# Altium footprint library ic.PcbLib: 129 footprints (part 8 of 9)
Each footprint in its own frame and in the unit in brackets; x right, y up, seen from the top. Pads: shape width x height; smd on the part's side, far side on the other; paste and mask are expansions set on the pad; w line width, h text height; cw(c..) or ccw(c..) is an arc to the next point about the centre after c.
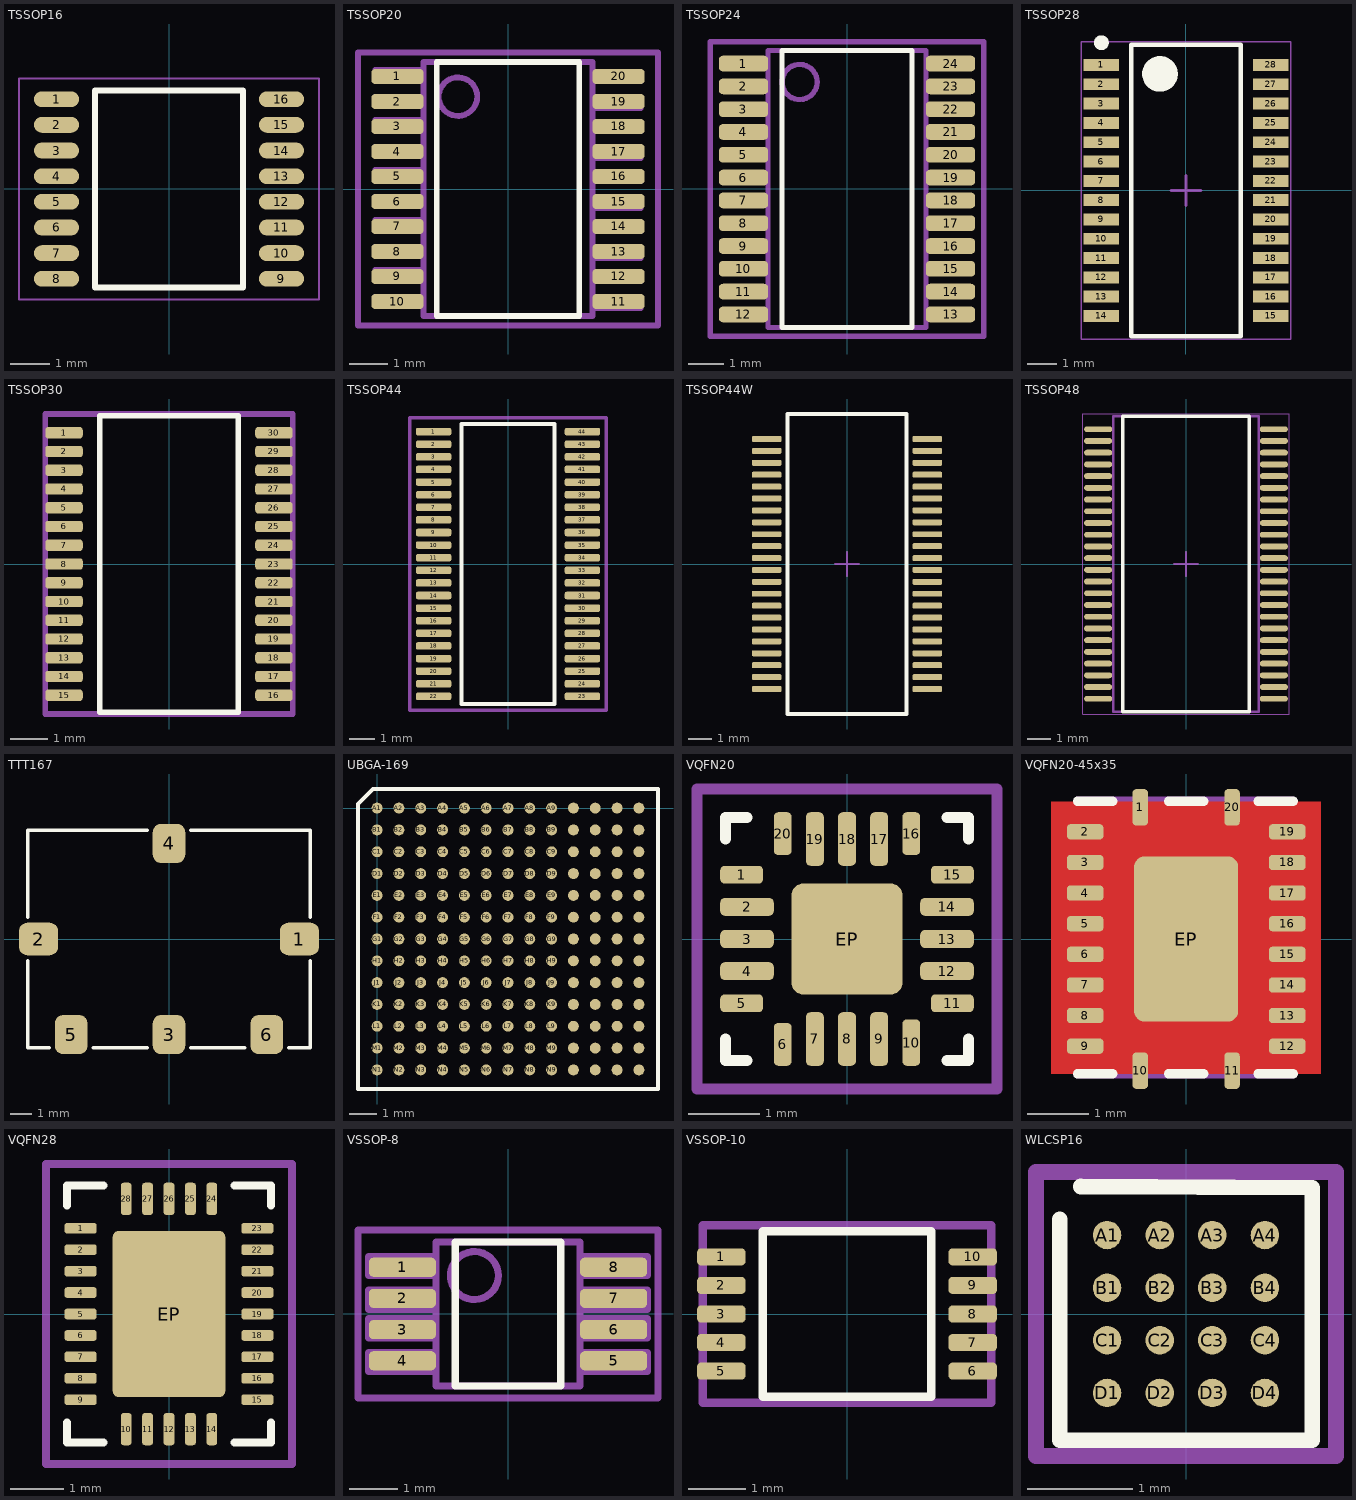
[diagram p7: the footprints below, top view; thin cyan lines are the x and y axes]

## TSSOP16 [mm] "TSOP, 16-Leads, Body 5,00x4,40mm, Pitch 0,65mm, IPC High Density"
height 1.2
pads (16):
  oval 1.15x0.4 smd: 1(-2.85,2.275) 2(-2.85,1.625) 3(-2.85,0.975) 4(-2.85,0.325) 5(-2.85,-0.325) 6(-2.85,-0.975) 7(-2.85,-1.625) 8(-2.85,-2.275) 9(2.85,-2.275) 10(2.85,-1.625) 11(2.85,-0.975) 12(2.85,-0.325) 13(2.85,0.325) 14(2.85,0.975) 15(2.85,1.625) 16(2.85,2.275)
Top Overlay:
  lines w0.15: -1.875,-2.5 -1.875,2.5 1.875,2.5 1.875,-2.5 -1.875,-2.5
  text "." at -2.9,3 h0.1
Top Courtyard:
  lines w0.05: -3.8,-2.8 -3.8,2.8 3.8,2.8 3.8,-2.8 -3.8,-2.8
3D body "TSSOP16.step": height 1.2, standoff 0, extent -3.2,-2.5 3.2,2.5

## TSSOP20 [mm] "TSSOP, 20-Leads, Body 6,50x4,40mm, Pitch 0,65mm, IPC Medium Density"
height 1.2
pads (20):
  rrect50% 1.35x0.4 smd: 1(-2.875,2.925) 2(-2.875,2.275) 3(-2.875,1.625) 4(-2.875,0.975) 5(-2.875,0.325) 6(-2.875,-0.325) 7(-2.875,-0.975) 8(-2.875,-1.625) 9(-2.875,-2.275) 10(-2.875,-2.925) 11(2.875,-2.925) 12(2.875,-2.275) 13(2.875,-1.625) 14(2.875,-0.975) 15(2.875,-0.325) 16(2.875,0.325) 17(2.875,0.975) 18(2.875,1.625) 19(2.875,2.275) 20(2.875,2.925)
Top Overlay:
  lines w0.15: -1.85,-3.3 1.85,-3.3 1.85,3.3 -1.85,3.3 -1.85,-3.3
  text "." at -2.9,3.6 h0.1
Top Courtyard:
  lines w0.15: -3.9,-3.55 3.9,-3.55 3.9,3.55 -3.9,3.55 -3.9,-3.55
Mechanical 29:
  circle w0.15: c-1.3,2.4 r0.5
  lines w0.15: -2.2,-3 -3.45,-3 -3.45,-2.8 -2.2,-2.8 ; -2.2,-2.3 -3.45,-2.3 -3.45,-2.1 -2.2,-2.1 ; -2.2,-1.7 -3.45,-1.7 -3.45,-1.5 -2.2,-1.5 ; -2.2,-1 -3.45,-1 -3.45,-0.8 -2.2,-0.8 ; -2.2,-0.4 -3.45,-0.4 -3.45,-0.2 -2.2,-0.2 ; -2.2,0.3 -3.45,0.3 -3.45,0.5 -2.2,0.5 ; -2.2,0.9 -3.45,0.9 -3.45,1.1 -2.2,1.1 ; -2.2,1.6 -3.45,1.6 -3.45,1.8 -2.2,1.8 ; -2.2,2.2 -3.45,2.2 -3.45,2.4 -2.2,2.4 ; -2.2,2.9 -3.45,2.9 -3.45,3.1 -2.2,3.1 ; 2.2,-3.1 3.45,-3.1 3.45,-2.9 2.2,-2.9 ; 2.2,-2.4 3.45,-2.4 3.45,-2.2 2.2,-2.2 ; 2.2,-1.8 3.45,-1.8 3.45,-1.6 2.2,-1.6 ; 2.2,-1.1 3.45,-1.1 3.45,-0.9 2.2,-0.9 ; 2.2,-0.5 3.45,-0.5 3.45,-0.3 2.2,-0.3 ; 2.2,0.2 3.45,0.2 3.45,0.4 2.2,0.4 ; 2.2,0.8 3.45,0.8 3.45,1 2.2,1 ; 2.2,1.5 3.45,1.5 3.45,1.7 2.2,1.7 ; 2.2,2.1 3.45,2.1 3.45,2.3 2.2,2.3 ; 2.2,2.8 3.45,2.8 3.45,3 2.2,3 ; -2.2,-3.3 2.2,-3.3 2.2,3.3 -2.2,3.3 -2.2,-3.3
  text ".Designator" at -3.3,3.6 h1
3D body "TSSOP-20.step": height 1.2, standoff 0, extent -3.2,-3.3 3.2,3.3

## TSSOP24 [mm] "TSOP, 24-Leads, Body 7,80x4,40mm, Pitch 0,65mm, IPC Medium Density"
height 1.1
pads (24):
  rrect50% 1.4x0.45 smd: 1(-2.95,3.575) 2(-2.95,2.925) 3(-2.95,2.275) 4(-2.95,1.625) 5(-2.95,0.975) 6(-2.95,0.325) 7(-2.95,-0.325) 8(-2.95,-0.975) 9(-2.95,-1.625) 10(-2.95,-2.275) 11(-2.95,-2.925) 12(-2.95,-3.575) 13(2.95,-3.575) 14(2.95,-2.925) 15(2.95,-2.275) 16(2.95,-1.625) 17(2.95,-0.975) 18(2.95,-0.325) 19(2.95,0.325) 20(2.95,0.975) 21(2.95,1.625) 22(2.95,2.275) 23(2.95,2.925) 24(2.95,3.575)
Top Overlay:
  lines w0.15: -1.85,-3.95 1.85,-3.95 1.85,3.95 -1.85,3.95 -1.85,-3.95
  text "." at -3,4.3 h0.1
Top Courtyard:
  lines w0.15: -3.9,-4.2 3.9,-4.2 3.9,4.2 -3.9,4.2 -3.9,-4.2
Mechanical 29:
  circle w0.15: c-1.35,3.05 r0.5
  lines w0.15: -2.25,-3.7 -3.5,-3.7 -3.5,-3.5 -2.25,-3.5 ; -2.25,-3 -3.5,-3 -3.5,-2.8 -2.25,-2.8 ; -2.25,-2.4 -3.5,-2.4 -3.5,-2.2 -2.25,-2.2 ; -2.25,-1.7 -3.5,-1.7 -3.5,-1.5 -2.25,-1.5 ; -2.25,-1.1 -3.5,-1.1 -3.5,-0.9 -2.25,-0.9 ; -2.25,-0.4 -3.5,-0.4 -3.5,-0.2 -2.25,-0.2 ; -2.25,0.2 -3.5,0.2 -3.5,0.4 -2.25,0.4 ; -2.25,0.9 -3.5,0.9 -3.5,1.1 -2.25,1.1 ; -2.25,1.5 -3.5,1.5 -3.5,1.7 -2.25,1.7 ; -2.25,2.2 -3.5,2.2 -3.5,2.4 -2.25,2.4 ; -2.25,2.8 -3.5,2.8 -3.5,3 -2.25,3 ; -2.25,3.5 -3.5,3.5 -3.5,3.7 -2.25,3.7 ; 2.25,-3.7 3.5,-3.7 3.5,-3.5 2.25,-3.5 ; 2.25,-3 3.5,-3 3.5,-2.8 2.25,-2.8 ; 2.25,-2.4 3.5,-2.4 3.5,-2.2 2.25,-2.2 ; 2.25,-1.7 3.5,-1.7 3.5,-1.5 2.25,-1.5 ; 2.25,-1.1 3.5,-1.1 3.5,-0.9 2.25,-0.9 ; 2.25,-0.4 3.5,-0.4 3.5,-0.2 2.25,-0.2 ; 2.25,0.2 3.5,0.2 3.5,0.4 2.25,0.4 ; 2.25,0.9 3.5,0.9 3.5,1.1 2.25,1.1 ; 2.25,1.5 3.5,1.5 3.5,1.7 2.25,1.7 ; 2.25,2.2 3.5,2.2 3.5,2.4 2.25,2.4 ; 2.25,2.8 3.5,2.8 3.5,3 2.25,3 ; 2.25,3.5 3.5,3.5 3.5,3.7 2.25,3.7 ; -2.25,-3.95 2.25,-3.95 2.25,3.95 -2.25,3.95 -2.25,-3.95
  text ".Designator" at -2,-0.4 h1

## TSSOP28 [mm] "TSOP, 28-Leads, Body 9,70x4,40mm, Pitch 0,65mm, IPC High Density"
height 1.2
pads (28):
  rect 1.2x0.4 smd: 1(-2.85,4.225) 2(-2.85,3.575) 3(-2.85,2.925) 4(-2.85,2.275) 5(-2.85,1.625) 6(-2.85,0.975) 7(-2.85,0.325) 8(-2.85,-0.325) 9(-2.85,-0.975) 10(-2.85,-1.625) 11(-2.85,-2.275) 12(-2.85,-2.925) 13(-2.85,-3.575) 14(-2.85,-4.225) 15(2.85,-4.225) 16(2.85,-3.575) 17(2.85,-2.925) 18(2.85,-2.275) 19(2.85,-1.625) 20(2.85,-0.975) 21(2.85,-0.325) 22(2.85,0.325) 23(2.85,0.975) 24(2.85,1.625) 25(2.85,2.275) 26(2.85,2.925) 27(2.85,3.575) 28(2.85,4.225)
Top Overlay:
  circle w0.25: c-2.85,4.975 r0.125
  circle w0.6: c-0.875,3.925 r0.3
  lines w0.15: -1.85,-4.9 -1.85,4.9 1.85,4.9 1.85,-4.9 -1.85,-4.9
Top Courtyard:
  lines w0.05: -3.525,-5 -3.525,5 3.525,5 3.525,-5 -3.525,-5
  lines w0.1: -0.5,0 0.5,0 ; 0,-0.5 0,0.5
3D body "TSSOP28.step": height 2.65, standoff 0, extent -3.2,-4.9 3.2,4.9

## TSSOP30 [mm] "TSSOP, 30-Leads, Body 7,80x4,40mm, Pitch 0,50mm, IPC Medium Density"
height 1.2
pads (30):
  rrect50% 1x0.3 smd: 1(-2.8,3.5) 2(-2.8,3) 3(-2.8,2.5) 4(-2.8,2) 5(-2.8,1.5) 6(-2.8,1) 7(-2.8,0.5) 8(-2.8,0) 9(-2.8,-0.5) 10(-2.8,-1) 11(-2.8,-1.5) 12(-2.8,-2) 13(-2.8,-2.5) 14(-2.8,-3) 15(-2.8,-3.5) 16(2.8,-3.5) 17(2.8,-3) 18(2.8,-2.5) 19(2.8,-2) 20(2.8,-1.5) 21(2.8,-1) 22(2.8,-0.5) 23(2.8,0) 24(2.8,0.5) 25(2.8,1) 26(2.8,1.5) 27(2.8,2) 28(2.8,2.5) 29(2.8,3) 30(2.8,3.5)
Top Overlay:
  lines w0.15: -1.85,-3.95 -1.85,3.95 1.85,3.95 1.85,-3.95 -1.85,-3.95
  text "." at -2.948,4 h0.1
Top Courtyard:
  lines w0.15: -3.3,-4 -3.3,4 3.3,4 3.3,-4 -3.3,-4
3D body "TSSOP30.step": height 1.2, standoff 0, extent -3.2,-3.95 3.2,3.95

## TSSOP44 [mm] "TSSOP, 44-Leads, Body 11,00x4,40mm, Pitch 0,50mm, IPC Medium Density"
height 1.2
pads (44):
  rrect50% 1.4x0.3 smd: 1(-2.95,5.25) 2(-2.95,4.75) 3(-2.95,4.25) 4(-2.95,3.75) 5(-2.95,3.25) 6(-2.95,2.75) 7(-2.95,2.25) 8(-2.95,1.75) 9(-2.95,1.25) 10(-2.95,0.75) 11(-2.95,0.25) 12(-2.95,-0.25) 13(-2.95,-0.75) 14(-2.95,-1.25) 15(-2.95,-1.75) 16(-2.95,-2.25) 17(-2.95,-2.75) 18(-2.95,-3.25) 19(-2.95,-3.75) 20(-2.95,-4.25) 21(-2.95,-4.75) 22(-2.95,-5.25) 23(2.95,-5.25) 24(2.95,-4.75) 25(2.95,-4.25) 26(2.95,-3.75) 27(2.95,-3.25) 28(2.95,-2.75) 29(2.95,-2.25) 30(2.95,-1.75) 31(2.95,-1.25) 32(2.95,-0.75) 33(2.95,-0.25) 34(2.95,0.25) 35(2.95,0.75) 36(2.95,1.25) 37(2.95,1.75) 38(2.95,2.25) 39(2.95,2.75) 40(2.95,3.25) 41(2.95,3.75) 42(2.95,4.25) 43(2.95,4.75) 44(2.95,5.25)
Top Overlay:
  lines w0.15: -1.85,-5.55 1.85,-5.55 1.85,5.55 -1.85,5.55 -1.85,-5.55
  text "." at -3,5.9 h0.1
Top Courtyard:
  lines w0.15: -3.9,-5.8 -3.9,5.8 3.9,5.8 3.9,-5.8 -3.9,-5.8
3D body "TSSOP44.step": height 1.2, standoff 0, extent -3.2,-5.55 3.2,5.55

## TSSOP44W [mm] "SSOP, 44-Leads, Body 12,80x5,30mm, Pitch 0,50mm, IPC High Density"
height 2
pads (44):
  rrect50% 1.25x0.25 smd: 1(-3.375,5.25) 2(-3.375,4.75) 3(-3.375,4.25) 4(-3.375,3.75) 5(-3.375,3.25) 6(-3.375,2.75) 7(-3.375,2.25) 8(-3.375,1.75) 9(-3.375,1.25) 10(-3.375,0.75) 11(-3.375,0.25) 12(-3.375,-0.25) 13(-3.375,-0.75) 14(-3.375,-1.25) 15(-3.375,-1.75) 16(-3.375,-2.25) 17(-3.375,-2.75) 18(-3.375,-3.25) 19(-3.375,-3.75) 20(-3.375,-4.25) 21(-3.375,-4.75) 22(-3.375,-5.25) 23(3.375,-5.25) 24(3.375,-4.75) 25(3.375,-4.25) 26(3.375,-3.75) 27(3.375,-3.25) 28(3.375,-2.75) 29(3.375,-2.25) 30(3.375,-1.75) 31(3.375,-1.25) 32(3.375,-0.75) 33(3.375,-0.25) 34(3.375,0.25) 35(3.375,0.75) 36(3.375,1.25) 37(3.375,1.75) 38(3.375,2.25) 39(3.375,2.75) 40(3.375,3.25) 41(3.375,3.75) 42(3.375,4.25) 43(3.375,4.75) 44(3.375,5.25)
Top Overlay:
  lines w0.15: -2.5,-6.3 -2.5,6.3 2.5,6.3 2.5,-6.3 -2.5,-6.3
  text "." at -4,6 h0.1
Top Courtyard:
  lines w0.1: -0.5,0 0.5,0 ; 0,-0.5 0,0.5
3D body "TSSOP44.step": height 1.2, standoff 0, extent -3.2,-5.55 3.2,5.55

## TSSOP48 [mm] "TSSOP, 48-Leads, Body 12,50x6,10mm, Pitch 0,50mm, IPC High Density"
height 1.2
pads (48):
  oval 1.2x0.25 smd: 1(-3.75,5.75) 2(-3.75,5.25) 3(-3.75,4.75) 4(-3.75,4.25) 5(-3.75,3.75) 6(-3.75,3.25) 7(-3.75,2.75) 8(-3.75,2.25) 9(-3.75,1.75) 10(-3.75,1.25) 11(-3.75,0.75) 12(-3.75,0.25) 13(-3.75,-0.25) 14(-3.75,-0.75) 15(-3.75,-1.25) 16(-3.75,-1.75) 17(-3.75,-2.25) 18(-3.75,-2.75) 19(-3.75,-3.25) 20(-3.75,-3.75) 21(-3.75,-4.25) 22(-3.75,-4.75) 23(-3.75,-5.25) 24(-3.75,-5.75) 25(3.75,-5.75) 26(3.75,-5.25) 27(3.75,-4.75) 28(3.75,-4.25) 29(3.75,-3.75) 30(3.75,-3.25) 31(3.75,-2.75) 32(3.75,-2.25) 33(3.75,-1.75) 34(3.75,-1.25) 35(3.75,-0.75) 36(3.75,-0.25) 37(3.75,0.25) 38(3.75,0.75) 39(3.75,1.25) 40(3.75,1.75) 41(3.75,2.25) 42(3.75,2.75) 43(3.75,3.25) 44(3.75,3.75) 45(3.75,4.25) 46(3.75,4.75) 47(3.75,5.25) 48(3.75,5.75)
Top Overlay:
  lines w0.15: -2.7,-6.3 -2.7,6.3 2.7,6.3 2.7,-6.3 -2.7,-6.3
  text "." at -3.824,6.401 h0.1
Top Courtyard:
  lines w0.05: -4.4,-6.4 -4.4,6.4 4.4,6.4 4.4,-6.4 -4.4,-6.4
  lines w0.1: -0.5,0 0.5,0 ; 0,-0.5 0,0.5
Top Assembly:
  lines w0.1: -3.1,-6.3 -3.1,6.3 3.1,6.3 3.1,-6.3 -3.1,-6.3
3D body "TSSOP48.step": height 1.2, standoff 0, extent -4.05,-6.3 4.05,6.3

## TTT167 [mm]
height 6
pads (6):
  rrect50% 1.8x1.5 smd: 1(6,0) 2(-6,0)
  rrect50% 1.5x1.8 smd: 3(0,-4.4) 4(0,4.4) 5(-4.5,-4.4) 6(4.5,-4.4)
Top Overlay:
  lines w0.15: -6.5,-1 -6.5,-5 -5.5,-5 ; -6.5,1 -6.5,5 -1,5 ; -3.5,-5 -1,-5 ; 1,-5 3.5,-5 ; 1,5 6.5,5 6.5,1 ; 5.5,-5 6.5,-5 6.5,-1
3D body: height 0.5, standoff 0, extent -6.35,-4.825 6.35,4.825
3D body: height 6, standoff 0.5, extent -6,-4.4 6,4.4

## UBGA-169 [mm] "BGA289_0P8_14X14"
height 0.1
pads (169):
  round 0.4 smd mask-0.01: A1(0,0) A2(0.8,0) A3(1.6,0) A4(2.4,0) A5(3.2,0) A6(4,0) A7(4.8,0) A8(5.6,0) A9(6.4,0) A10(7.2,0) A11(8,0) A12(8.8,0) A13(9.6,0) B1(0,-0.8) B2(0.8,-0.8) B3(1.6,-0.8) B4(2.4,-0.8) B5(3.2,-0.8) B6(4,-0.8) B7(4.8,-0.8) B8(5.6,-0.8) B9(6.4,-0.8) B10(7.2,-0.8) B11(8,-0.8) B12(8.8,-0.8) B13(9.6,-0.8) C1(0,-1.6) C2(0.8,-1.6) C3(1.6,-1.6) C4(2.4,-1.6) C5(3.2,-1.6) C6(4,-1.6) C7(4.8,-1.6) C8(5.6,-1.6) C9(6.4,-1.6) C10(7.2,-1.6) C11(8,-1.6) C12(8.8,-1.6) C13(9.6,-1.6) D1(0,-2.4) D2(0.8,-2.4) D3(1.6,-2.4) D4(2.4,-2.4) D5(3.2,-2.4) D6(4,-2.4) D7(4.8,-2.4) D8(5.6,-2.4) D9(6.4,-2.4) D10(7.2,-2.4) D11(8,-2.4) D12(8.8,-2.4) D13(9.6,-2.4) E1(0,-3.2) E2(0.8,-3.2) E3(1.6,-3.2) E4(2.4,-3.2) E5(3.2,-3.2) E6(4,-3.2) E7(4.8,-3.2) E8(5.6,-3.2) E9(6.4,-3.2) E10(7.2,-3.2) E11(8,-3.2) E12(8.8,-3.2) E13(9.6,-3.2) F1(0,-4) F2(0.8,-4) F3(1.6,-4) F4(2.4,-4) F5(3.2,-4) F6(4,-4) F7(4.8,-4) F8(5.6,-4) F9(6.4,-4) F10(7.2,-4) F11(8,-4) F12(8.8,-4) F13(9.6,-4) G1(0,-4.8) G2(0.8,-4.8) G3(1.6,-4.8) G4(2.4,-4.8) G5(3.2,-4.8) G6(4,-4.8) G7(4.8,-4.8) G8(5.6,-4.8) G9(6.4,-4.8) G10(7.2,-4.8) G11(8,-4.8) G12(8.8,-4.8) G13(9.6,-4.8) H1(0,-5.6) H2(0.8,-5.6) H3(1.6,-5.6) H4(2.4,-5.6) H5(3.2,-5.6) H6(4,-5.6) H7(4.8,-5.6) H8(5.6,-5.6) H9(6.4,-5.6) H10(7.2,-5.6) H11(8,-5.6) H12(8.8,-5.6) H13(9.6,-5.6) J1(0,-6.4) J2(0.8,-6.4) J3(1.6,-6.4) J4(2.4,-6.4) J5(3.2,-6.4) J6(4,-6.4) J7(4.8,-6.4) J8(5.6,-6.4) J9(6.4,-6.4) J10(7.2,-6.4) J11(8,-6.4) J12(8.8,-6.4) J13(9.6,-6.4) K1(0,-7.2) K2(0.8,-7.2) K3(1.6,-7.2) K4(2.4,-7.2) K5(3.2,-7.2) K6(4,-7.2) K7(4.8,-7.2) K8(5.6,-7.2) K9(6.4,-7.2) K10(7.2,-7.2) K11(8,-7.2) K12(8.8,-7.2) K13(9.6,-7.2) L1(0,-8) L2(0.8,-8) L3(1.6,-8) L4(2.4,-8) L5(3.2,-8) L6(4,-8) L7(4.8,-8) L8(5.6,-8) L9(6.4,-8) L10(7.2,-8) L11(8,-8) L12(8.8,-8) L13(9.6,-8) M1(0,-8.8) M2(0.8,-8.8) M3(1.6,-8.8) M4(2.4,-8.8) M5(3.2,-8.8) M6(4,-8.8) M7(4.8,-8.8) M8(5.6,-8.8) M9(6.4,-8.8) M10(7.2,-8.8) M11(8,-8.8) M12(8.8,-8.8) M13(9.6,-8.8) N1(0,-9.6) N2(0.8,-9.6) N3(1.6,-9.6) N4(2.4,-9.6) N5(3.2,-9.6) N6(4,-9.6) N7(4.8,-9.6) N8(5.6,-9.6) N9(6.4,-9.6) N10(7.2,-9.6) N11(8,-9.6) N12(8.8,-9.6) N13(9.6,-9.6)
Top Overlay:
  lines w0.152: -0.7,-10.3 -0.7,0.15 -0.15,0.7 10.3,0.7 10.3,-10.3 -0.7,-10.3
3D body: height 0.85, standoff 0.2, extent -0.7,-10.3 10.325,0.7

## VQFN20 [mm] "VQFN, 20-Leads, Body 3,00x3,00mm, Pitch 0,45mm, Thermal Pad 1,55x1,55mm, IPC Medium Density"
height 0.85
pads (21):
  rrect50% 0.6x0.25 smd: 1(-1.475,0.9) 5(-1.475,-0.9) 11(1.475,-0.9) 15(1.475,0.9)
  rrect50% 0.75x0.25 smd: 2(-1.4,0.45) 3(-1.4,0) 4(-1.4,-0.45) 12(1.4,-0.45) 13(1.4,0) 14(1.4,0.45)
  rrect50% 0.25x0.6 smd: 6(-0.9,-1.475) 16(0.9,1.475) 20(-0.9,1.475)
  rrect50% 0.25x0.75 smd: 7(-0.45,-1.4) 8(0,-1.4) 9(0.45,-1.4) 17(0.45,1.4) 18(0,1.4) 19(-0.45,1.4)
  rrect50% 0.25x0.65 smd: 10(0.9,-1.45)
  rrect20% 1.55x1.55 smd: EP(0,0)
Top Overlay:
  lines w0.15: -1.7,-1.4 -1.7,-1.7 -1.4,-1.7 ; -1.7,1.4 -1.7,1.7 -1.4,1.7 ; 1.4,-1.7 1.7,-1.7 1.7,-1.4 ; 1.4,1.7 1.7,1.7 1.7,1.4
  text "." at -2.355,1.559 h0.1
Top Courtyard:
  lines w0.15: -2.1,-2.1 -2.1,2.1 2.1,2.1 2.1,-2.1 -2.1,-2.1
3D body "VQFN20.step": height 0.85, standoff 0, extent -1.57,-1.57 1.57,1.57

## VQFN20-45x35 [mm] "VQFN, 20-Leads, Body 3,00x3,00mm, Pitch 0,45mm, Thermal Pad 1,55x1,55mm, IPC Medium Density"
height 0.85
pads (21):
  rrect50% 0.25x0.6 smd: 1(-0.75,2.15) 10(-0.75,-2.15) 11(0.75,-2.15) 20(0.75,2.15)
  rrect50% 0.6x0.25 smd: 2(-1.65,1.75) 3(-1.65,1.25) 4(-1.65,0.75) 5(-1.65,0.25) 6(-1.65,-0.25) 7(-1.65,-0.75) 8(-1.65,-1.25) 9(-1.65,-1.75) 12(1.65,-1.75) 13(1.65,-1.25) 14(1.65,-0.75) 15(1.65,-0.25) 16(1.65,0.25) 17(1.65,0.75) 18(1.65,1.25) 19(1.65,1.75)
  rrect20% 1.7x2.7 smd: EP(0,0)
Top Layer:
  pour cut-out: 2.201,-2.2 2.201,2.242 -2.207,2.242 -2.207,-2.2
Top Overlay:
  lines w0.15: -1.775,-2.2 -1.2,-2.2 ; -1.775,2.25 -1.2,2.25 ; -0.288,-2.2 0.288,-2.2 ; -0.288,2.25 0.288,2.25 ; 1.175,-2.2 1.75,-2.2 ; 1.175,2.25 1.75,2.25
  text "." at -1.524,2.705 h0.1
Top Courtyard:
  lines w0.15: -1.775,-2.2 1.75,-2.2 1.75,2.25 -1.775,2.25 -1.775,-2.2
3D body "RGY0020B.stp": height 1, standoff 0, extent -1.75,-2.25 1.75,2.25

## VQFN28 [mm]
height 1
pads (29):
  rrect50% 0.6x0.2 smd: 1(-1.65,1.6) 2(-1.65,1.2) 3(-1.65,0.8) 4(-1.65,0.4) 5(-1.65,0) 6(-1.65,-0.4) 7(-1.65,-0.8) 8(-1.65,-1.2) 9(-1.65,-1.6) 15(1.65,-1.6) 16(1.65,-1.2) 17(1.65,-0.8) 18(1.65,-0.4) 19(1.65,0) 20(1.65,0.4) 21(1.65,0.8) 22(1.65,1.2) 23(1.65,1.6)
  rrect50% 0.2x0.6 smd: 10(-0.8,-2.15) 11(-0.4,-2.15) 12(0,-2.15) 13(0.4,-2.15) 14(0.8,-2.15) 24(0.8,2.15) 25(0.4,2.15) 26(0,2.15) 27(-0.4,2.15) 28(-0.8,2.15)
  rrect10% 2.1x3.1 smd: EP(0,0)
Top Overlay:
  lines w0.15: -1.9,-2.027 -1.9,-2.4 -1.227,-2.4 ; -1.9,2.027 -1.9,2.4 -1.227,2.4 ; 1.227,-2.4 1.9,-2.4 1.9,-2.027 ; 1.227,2.4 1.9,2.4 1.9,2.027
  text "." at -2.383,2.038 h0.1
Top Courtyard:
  lines w0.15: -2.3,-2.8 2.3,-2.8 2.3,2.8 -2.3,2.8 -2.3,-2.8
3D body: height 1, standoff 0, extent -1.8,-2.3 1.8,2.3

## VSSOP-8 [mm] "TSOP, 8-Leads, Body 3,00x3,00mm, Pitch 0,65mm, IPC Medium Density"
height 1.1
pads (8):
  rrect50% 1.4x0.4 smd: 1(-2.2,0.975) 2(-2.2,0.325) 3(-2.2,-0.325) 4(-2.2,-0.975) 5(2.2,-0.975) 6(2.2,-0.325) 7(2.2,0.325) 8(2.2,0.975)
Top Overlay:
  lines w0.15: -1.1,-1.5 -1.1,1.5 1.1,1.5 1.1,-1.5 -1.1,-1.5
  text "." at -2.2,1.7 h0.1
Top Courtyard:
  lines w0.15: -3.125,-1.75 -3.125,1.75 3.125,1.75 3.125,-1.75 -3.125,-1.75
Mechanical 29:
  circle w0.15: c-0.7,0.8 r0.5
  lines w0.15: -1.5,-1.2 -2.9,-1.2 -2.9,-0.8 -1.5,-0.8 ; -1.5,-0.5 -2.9,-0.5 -2.9,-0.1 -1.5,-0.1 ; -1.5,0.1 -2.9,0.1 -2.9,0.5 -1.5,0.5 ; -1.5,0.8 -2.9,0.8 -2.9,1.2 -1.5,1.2 ; 1.5,-1.2 2.9,-1.2 2.9,-0.8 1.5,-0.8 ; 1.5,-0.5 2.9,-0.5 2.9,-0.1 1.5,-0.1 ; 1.5,0.1 2.9,0.1 2.9,0.5 1.5,0.5 ; 1.5,0.8 2.9,0.8 2.9,1.2 1.5,1.2 ; -1.5,-1.5 1.5,-1.5 1.5,1.5 -1.5,1.5 -1.5,-1.5
  text ".Designator" at -2.7,2 h1
3D body "VSSOP-8.step": height 1.1, standoff 0, extent -2.45,-1.5 2.45,1.5

## VSSOP-10 [mm] "VSSOP, 10-Leads, Body 3,00x3,00mm, Pitch 0,50mm, IPC High Density"
height 1.1
pads (10):
  rrect50% 0.85x0.3 smd: 1(-2.2,1) 2(-2.2,0.5) 3(-2.2,0) 4(-2.2,-0.5) 5(-2.2,-1) 6(2.2,-1) 7(2.2,-0.5) 8(2.2,0) 9(2.2,0.5) 10(2.2,1)
Top Overlay:
  lines w0.15: -1.475,-1.45 1.475,-1.45 1.475,1.45 -1.475,1.45 -1.475,-1.45
  text "." at -2.255,1.759 h0.1
Top Courtyard:
  lines w0.15: -2.525,-1.55 2.525,-1.55 2.525,1.55 -2.525,1.55 -2.525,-1.55
3D body "VSSOP-10.step": height 1.1, standoff 0, extent -2.45,-1.55 2.45,1.55

## WLCSP16 [mm] "BGA, 16-Leads, Body 2,32x2,17mmx0,60mm, Pitch 0,50mm"
height 0.6
pads (16):
  round 0.27 smd: A1(-0.75,0.75) A2(-0.25,0.75) A3(0.25,0.75) A4(0.75,0.75) B1(-0.75,0.25) B2(-0.25,0.25) B3(0.25,0.25) B4(0.75,0.25) C1(-0.75,-0.25) C2(-0.25,-0.25) C3(0.25,-0.25) C4(0.75,-0.25) D1(-0.75,-0.75) D2(-0.25,-0.75) D3(0.25,-0.75) D4(0.75,-0.75)
Top Overlay:
  lines w0.15: -1.2,0.9 -1.2,-1.2 1.2,-1.2 1.2,1.2 -1,1.21
  text "." at -1.425,1.35 h0.1
Top Courtyard:
  lines w0.15: -1.425,-1.35 -1.425,1.35 1.425,1.35 1.425,-1.35 -1.425,-1.35
3D body "WLCSP16.step": height 0.6, standoff 0, extent -1.16,-1.085 1.16,1.085